# Altium footprint library WR-TBL_Pluggable PCB Header.PcbLib: 719 footprints (part 13 of 45)
Each footprint in its own frame and in the unit in brackets; x right, y up, seen from the top. Pads: shape width x height; smd on the part's side, far side on the other; paste and mask are expansions set on the pad; w line width, h text height; cw(c..) or ccw(c..) is an arc to the next point about the centre after c.
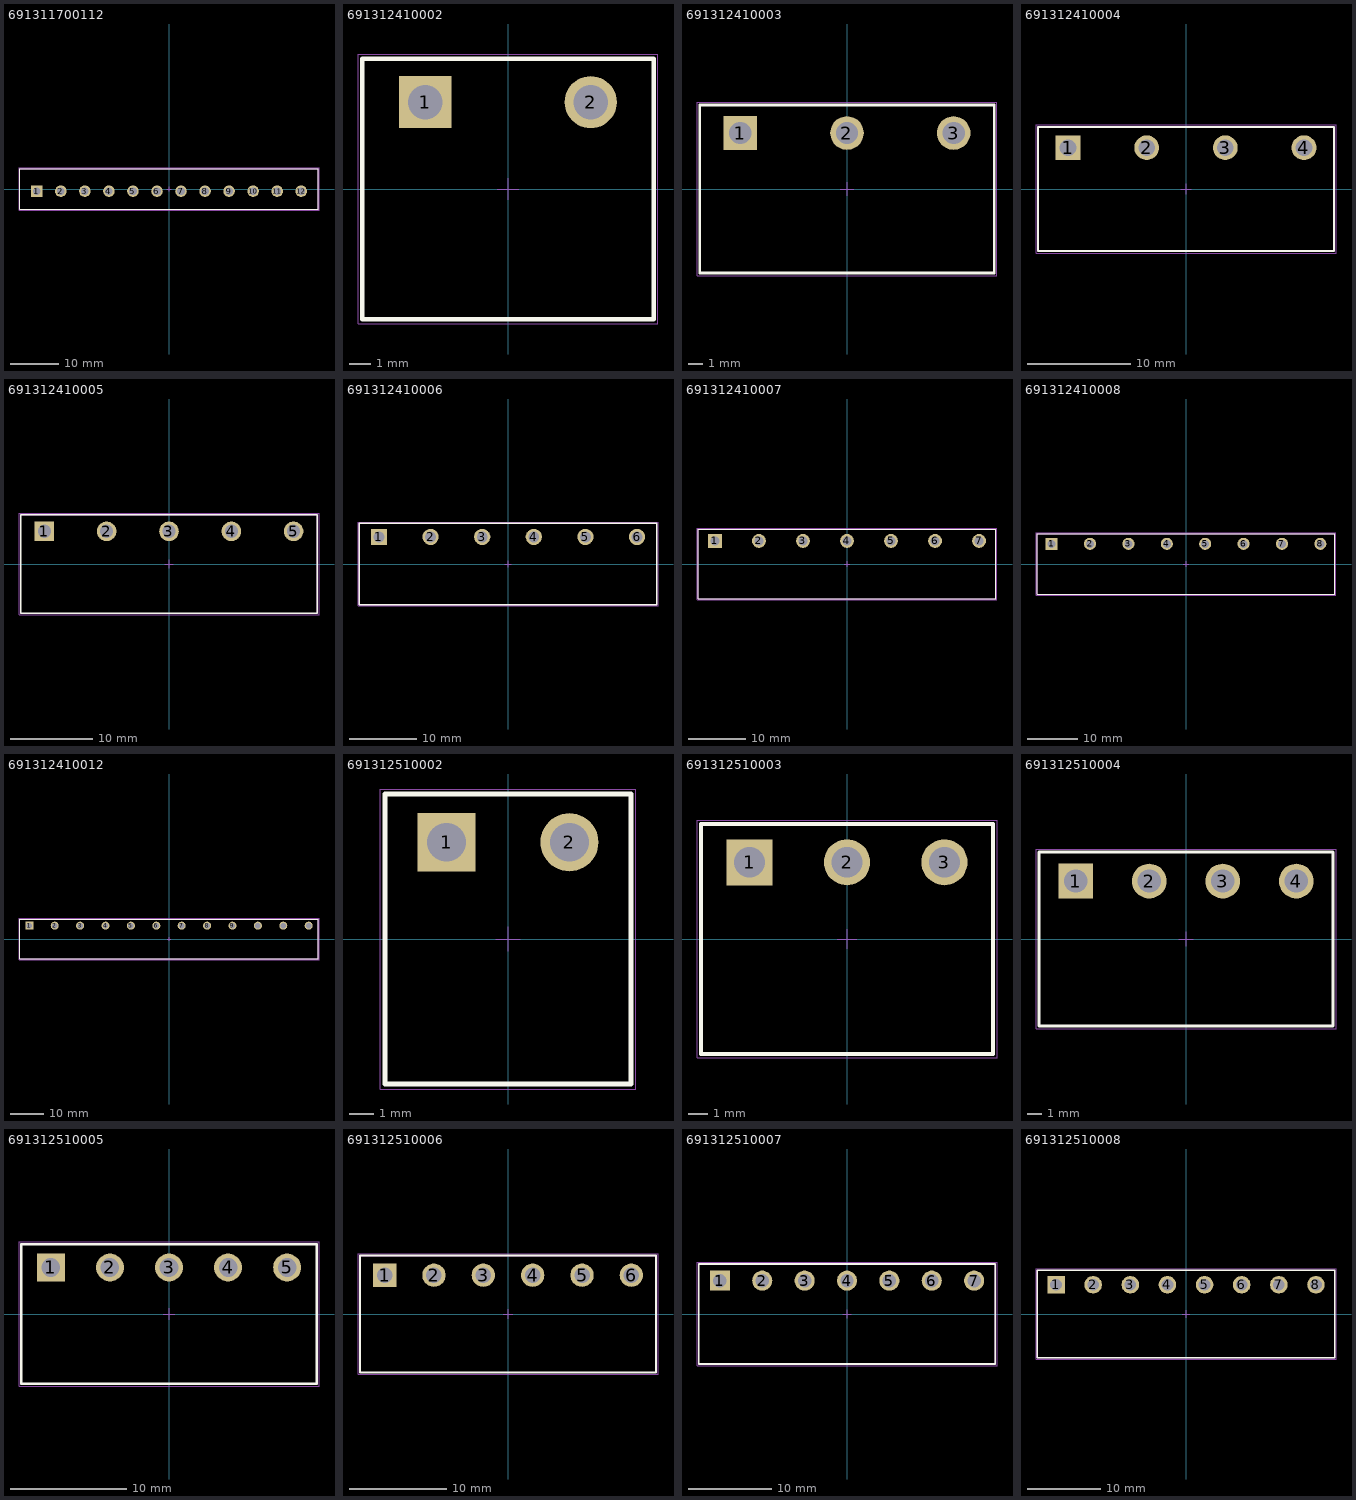
[diagram p12: the footprints below, top view; thin cyan lines are the x and y axes]

## 691311700112 [mm] "5.00mm - PCB Vertical Closed - 12p"
height 12
pads (12):
  rect 2.4x2.4 hole 1.6: 1(-27.5,-0.45)
  round 2.4 hole 1.6: 2(-22.5,-0.45) 3(-17.5,-0.45) 4(-12.5,-0.45) 5(-7.5,-0.45) 6(-2.5,-0.45) 7(2.5,-0.45) 8(7.5,-0.45) 9(12.5,-0.45) 10(17.5,-0.45) 11(22.5,-0.45) 12(27.5,-0.45)
Top Overlay:
  lines w0.2: -31,-4.25 -31,4.25 31,4.25 31,-4.25 -31,-4.25
Mechanical 13:
  lines w0.1: -31,-4.25 31,-4.25 31,4.25 -31,4.25 -31,-4.25
Mechanical 15:
  lines w0.05: -0.5,0 0.5,0 ; 0,-0.5 0,0.5 ; -31.2,-4.45 31.2,-4.45 31.2,4.45 -31.2,4.45 -31.2,-4.45
3D body "691311700112.stp": height 12.1, standoff -3.9, extent -31,-4.25 31,4.25

## 691312410002 [mm] "7.62 mm -Open Horizontal PCB Header - 02p"
height 8.5
pads (2):
  rect 2.4x2.4 hole 1.6: 1(-3.81,4)
  round 2.4 hole 1.6: 2(3.81,4)
Top Overlay:
  lines w0.2: -6.71,-6 -6.71,6 6.71,6 6.71,-6 -6.71,-6
Mechanical 13:
  lines w0.1: -6.71,-6 6.71,-6 6.71,6 -6.71,6 -6.71,-6
Mechanical 15:
  lines w0.05: -0.5,0 0.5,0 ; 0,-0.5 0,0.5 ; -6.91,-6.2 6.91,-6.2 6.91,6.2 -6.91,6.2 -6.91,-6.2
3D body "691312410002.stp": height 8.55, standoff -3.95, extent -6.71,-6 6.71,6

## 691312410003 [mm] "7.62 mm -Open Horizontal PCB Header - 03p"
height 8.5
pads (3):
  rect 2.4x2.4 hole 1.6: 1(-7.62,4)
  round 2.4 hole 1.6: 2(0,4) 3(7.62,4)
Top Overlay:
  lines w0.2: -10.52,-6 -10.52,6 10.52,6 10.52,-6 -10.52,-6
Mechanical 13:
  lines w0.1: -10.52,-6 10.52,-6 10.52,6 -10.52,6 -10.52,-6
Mechanical 15:
  lines w0.05: -0.5,0 0.5,0 ; 0,-0.5 0,0.5 ; -10.72,-6.2 10.72,-6.2 10.72,6.2 -10.72,6.2 -10.72,-6.2
3D body "691312410003.stp": height 8.55, standoff -3.95, extent -10.52,-6 10.52,6

## 691312410004 [mm] "7.62 mm -Open Horizontal PCB Header - 04p"
height 8.5
pads (4):
  rect 2.4x2.4 hole 1.6: 1(-11.43,4)
  round 2.4 hole 1.6: 2(-3.81,4) 3(3.81,4) 4(11.43,4)
Top Overlay:
  lines w0.2: -14.33,-6 -14.33,6 14.33,6 14.33,-6 -14.33,-6
Mechanical 13:
  lines w0.1: -14.33,-6 14.33,-6 14.33,6 -14.33,6 -14.33,-6
Mechanical 15:
  lines w0.05: -0.5,0 0.5,0 ; 0,-0.5 0,0.5 ; -14.53,-6.2 14.53,-6.2 14.53,6.2 -14.53,6.2 -14.53,-6.2
3D body "691312410004.stp": height 8.55, standoff -3.95, extent -14.33,-6 14.33,6

## 691312410005 [mm] "7.62 mm -Open Horizontal PCB Header - 05p"
height 8.5
pads (5):
  rect 2.4x2.4 hole 1.6: 1(-15.24,4)
  round 2.4 hole 1.6: 2(-7.62,4) 3(0,4) 4(7.62,4) 5(15.24,4)
Top Overlay:
  lines w0.2: -18.14,-6 18.14,-6 18.14,6 -18.14,6 -18.14,-6
Mechanical 13:
  lines w0.1: -18.14,-6 -18.14,6 18.14,6 18.14,-6 -18.14,-6
Mechanical 15:
  lines w0.05: -0.5,0 0.5,0 ; 0,-0.5 0,0.5 ; -18.34,-6.2 -18.34,6.2 18.34,6.2 18.34,-6.2 -18.34,-6.2
3D body "691312410005.stp": height 8.55, standoff -3.95, extent -18.14,-6 18.14,6

## 691312410006 [mm] "7.62 mm -Open Horizontal PCB Header - 06p"
height 8.5
pads (6):
  rect 2.4x2.4 hole 1.6: 1(-19.05,4)
  round 2.4 hole 1.6: 2(-11.43,4) 3(-3.81,4) 4(3.81,4) 5(11.43,4) 6(19.05,4)
Top Overlay:
  lines w0.2: -21.95,-6 21.95,-6 21.95,6 -21.95,6 -21.95,-6
Mechanical 13:
  lines w0.1: -21.95,-6 -21.95,6 21.95,6 21.95,-6 -21.95,-6
Mechanical 15:
  lines w0.05: -0.5,0 0.5,0 ; 0,-0.5 0,0.5 ; -22.15,-6.2 -22.15,6.2 22.15,6.2 22.15,-6.2 -22.15,-6.2
3D body "691312410006.stp": height 8.55, standoff -3.95, extent -21.95,-6 21.95,6

## 691312410007 [mm] "7.62 mm -Open Horizontal PCB Header - 07p"
height 8.5
pads (7):
  rect 2.4x2.4 hole 1.6: 1(-22.86,4)
  round 2.4 hole 1.6: 2(-15.24,4) 3(-7.62,4) 4(0,4) 5(7.62,4) 6(15.24,4) 7(22.86,4)
Top Overlay:
  lines w0.2: -25.76,-6 -25.76,6 25.76,6 25.76,-6 -25.76,-6
Mechanical 13:
  lines w0.1: -25.76,-6 25.76,-6 25.76,6 -25.76,6 -25.76,-6
Mechanical 15:
  lines w0.05: -0.5,0 0.5,0 ; 0,-0.5 0,0.5 ; -25.96,-6.2 25.96,-6.2 25.96,6.2 -25.96,6.2 -25.96,-6.2
3D body "691312410007.stp": height 8.55, standoff -3.95, extent -25.76,-6 25.76,6

## 691312410008 [mm] "7.62 mm -Open Horizontal PCB Header - 08p"
height 8.5
pads (8):
  rect 2.4x2.4 hole 1.6: 1(-26.67,4)
  round 2.4 hole 1.6: 2(-19.05,4) 3(-11.43,4) 4(-3.81,4) 5(3.81,4) 6(11.43,4) 7(19.05,4) 8(26.67,4)
Top Overlay:
  lines w0.2: -29.57,-6 -29.57,6 29.57,6 29.57,-6 -29.57,-6
Mechanical 13:
  lines w0.1: -29.57,-6 29.57,-6 29.57,6 -29.57,6 -29.57,-6
Mechanical 15:
  lines w0.05: -0.5,0 0.5,0 ; 0,-0.5 0,0.5 ; -29.77,-6.2 29.77,-6.2 29.77,6.2 -29.77,6.2 -29.77,-6.2
3D body "691312410008.stp": height 8.55, standoff -3.95, extent -29.57,-6 29.57,6

## 691312410012 [mm] "7.62 mm -Open Horizontal PCB Header - 12p"
height 8.5
pads (12):
  rect 2.4x2.4 hole 1.6: 1(-41.91,4)
  round 2.4 hole 1.6: 2(-34.29,4) 3(-26.67,4) 4(-19.05,4) 5(-11.43,4) 6(-3.81,4) 7(3.81,4) 8(11.43,4) 9(19.05,4) 10(26.67,4) 11(34.29,4) 12(41.91,4)
Top Overlay:
  lines w0.2: -44.81,-6 44.81,-6 44.81,6 -44.81,6 -44.81,-6
Mechanical 13:
  lines w0.1: -44.81,-6 -44.81,6 44.81,6 44.81,-6 -44.81,-6
Mechanical 15:
  lines w0.05: -0.5,0 0.5,0 ; 0,-0.5 0,0.5 ; -45.01,-6.2 -45.01,6.2 45.01,6.2 45.01,-6.2 -45.01,-6.2
3D body "691312410012.stp": height 8.55, standoff -3.95, extent -44.81,-6 44.81,6

## 691312510002 [mm] "5,08mm - PCB Headers - Horizontal - Opened ends - 02p"
height 8.5
pads (2):
  rect 2.4x2.4 hole 1.6: 1(-2.54,4)
  round 2.4 hole 1.6: 2(2.54,4)
Top Overlay:
  lines w0.2: -5.08,-6 -5.08,6 5.08,6 5.08,-6 -5.08,-6
Mechanical 13:
  lines w0.1: -5.08,-6 5.08,-6 5.08,6 -5.08,6 -5.08,-6
Mechanical 15:
  lines w0.05: -0.5,0 0.5,0 ; 0,-0.5 0,0.5 ; -5.28,-6.2 -5.28,6.2 5.28,6.2 5.28,-6.2 -5.28,-6.2
3D body "691312510002.stp": height 8.55, standoff -3.45, extent -5.08,-6 5.08,6

## 691312510003 [mm] "5,08mm - PCB Headers - Horizontal - Opened ends - 03p"
height 8.5
pads (3):
  rect 2.4x2.4 hole 1.6: 1(-5.08,4)
  round 2.4 hole 1.6: 2(0,4) 3(5.08,4)
Top Overlay:
  lines w0.2: -7.62,-6 -7.62,6 7.62,6 7.62,-6 -7.62,-6
Mechanical 13:
  lines w0.1: -7.62,-6 7.62,-6 7.62,6 -7.62,6 -7.62,-6
Mechanical 15:
  lines w0.05: -0.5,0 0.5,0 ; 0,-0.5 0,0.5 ; -7.82,-6.2 -7.82,6.2 7.82,6.2 7.82,-6.2 -7.82,-6.2
3D body "691312510003.stp": height 8.55, standoff -3.45, extent -7.62,-6 7.62,6

## 691312510004 [mm] "5,08mm - PCB Headers - Horizontal - Opened ends - 04p"
height 8.5
pads (4):
  rect 2.4x2.4 hole 1.6: 1(-7.62,4)
  round 2.4 hole 1.6: 2(-2.54,4) 3(2.54,4) 4(7.62,4)
Top Overlay:
  lines w0.2: -10.16,-6 10.16,-6 10.16,6 -10.16,6 -10.16,-6
Mechanical 13:
  lines w0.1: -10.16,-6 -10.16,6 10.16,6 10.16,-6 -10.16,-6
Mechanical 15:
  lines w0.05: -0.5,0 0.5,0 ; 0,-0.5 0,0.5 ; -10.36,-6.2 10.36,-6.2 10.36,6.2 -10.36,6.2 -10.36,-6.2
3D body "691312510004.stp": height 8.55, standoff -3.45, extent -10.16,-6 10.16,6

## 691312510005 [mm] "5,08mm - PCB Headers - Horizontal - Opened ends - 05p"
height 8.5
pads (5):
  rect 2.4x2.4 hole 1.6: 1(-10.16,4)
  round 2.4 hole 1.6: 2(-5.08,4) 3(0,4) 4(5.08,4) 5(10.16,4)
Top Overlay:
  lines w0.2: -12.7,-6 12.7,-6 12.7,6 -12.7,6 -12.7,-6
Mechanical 13:
  lines w0.1: -12.7,-6 -12.7,6 12.7,6 12.7,-6 -12.7,-6
Mechanical 15:
  lines w0.05: -0.5,0 0.5,0 ; 0,-0.5 0,0.5 ; -12.9,-6.2 12.9,-6.2 12.9,6.2 -12.9,6.2 -12.9,-6.2
3D body "691312510005.stp": height 8.55, standoff -3.45, extent -12.7,-6 12.7,6

## 691312510006 [mm] "5,08mm - PCB Headers - Horizontal - Opened ends - 06p"
height 8.5
pads (6):
  rect 2.4x2.4 hole 1.6: 1(-12.7,4)
  round 2.4 hole 1.6: 2(-7.62,4) 3(-2.54,4) 4(2.54,4) 5(7.62,4) 6(12.7,4)
Top Overlay:
  lines w0.2: -15.24,-6 -15.24,6 15.24,6 15.24,-6 -15.24,-6
Mechanical 13:
  lines w0.1: -15.24,-6 15.24,-6 15.24,6 -15.24,6 -15.24,-6
Mechanical 15:
  lines w0.05: -0.5,0 0.5,0 ; 0,-0.5 0,0.5 ; -15.44,-6.2 -15.44,6.2 15.44,6.2 15.44,-6.2 -15.44,-6.2
3D body "691312510006.stp": height 8.55, standoff -3.45, extent -15.24,-6 15.24,6

## 691312510007 [mm] "5,08mm - PCB Headers - Horizontal - Opened ends - 07p"
height 8.5
pads (7):
  rect 2.4x2.4 hole 1.6: 1(-15.24,4)
  round 2.4 hole 1.6: 2(-10.16,4) 3(-5.08,4) 4(0,4) 5(5.08,4) 6(10.16,4) 7(15.24,4)
Top Overlay:
  lines w0.2: -17.78,-6 17.78,-6 17.78,6 -17.78,6 -17.78,-6
Mechanical 13:
  lines w0.1: -17.78,-6 -17.78,6 17.78,6 17.78,-6 -17.78,-6
Mechanical 15:
  lines w0.05: -0.5,0 0.5,0 ; 0,-0.5 0,0.5 ; -17.98,-6.2 17.98,-6.2 17.98,6.2 -17.98,6.2 -17.98,-6.2
3D body "691312510007.stp": height 8.55, standoff -3.45, extent -17.78,-6 17.78,6

## 691312510008 [mm] "5,08mm - PCB Headers - Horizontal - Opened ends - 08p"
height 8.5
pads (8):
  rect 2.4x2.4 hole 1.6: 1(-17.78,4)
  round 2.4 hole 1.6: 2(-12.7,4) 3(-7.62,4) 4(-2.54,4) 5(2.54,4) 6(7.62,4) 7(12.7,4) 8(17.78,4)
Top Overlay:
  lines w0.2: -20.32,-6 20.32,-6 20.32,6 -20.32,6 -20.32,-6
Mechanical 13:
  lines w0.1: -20.32,-6 -20.32,6 20.32,6 20.32,-6 -20.32,-6
Mechanical 15:
  lines w0.05: -0.5,0 0.5,0 ; 0,-0.5 0,0.5 ; -20.52,-6.2 20.52,-6.2 20.52,6.2 -20.52,6.2 -20.52,-6.2
3D body "691312510008.stp": height 8.55, standoff -3.45, extent -20.32,-6 20.32,6